# Altium footprint library con-samtec.PCBLIB: 805 footprints (part 48 of 55)
Each footprint in its own frame and in the unit in brackets; x right, y up, seen from the top. Pads: shape width x height; smd on the part's side, far side on the other; paste and mask are expansions set on the pad; w line width, h text height; cw(c..) or ccw(c..) is an arc to the next point about the centre after c.
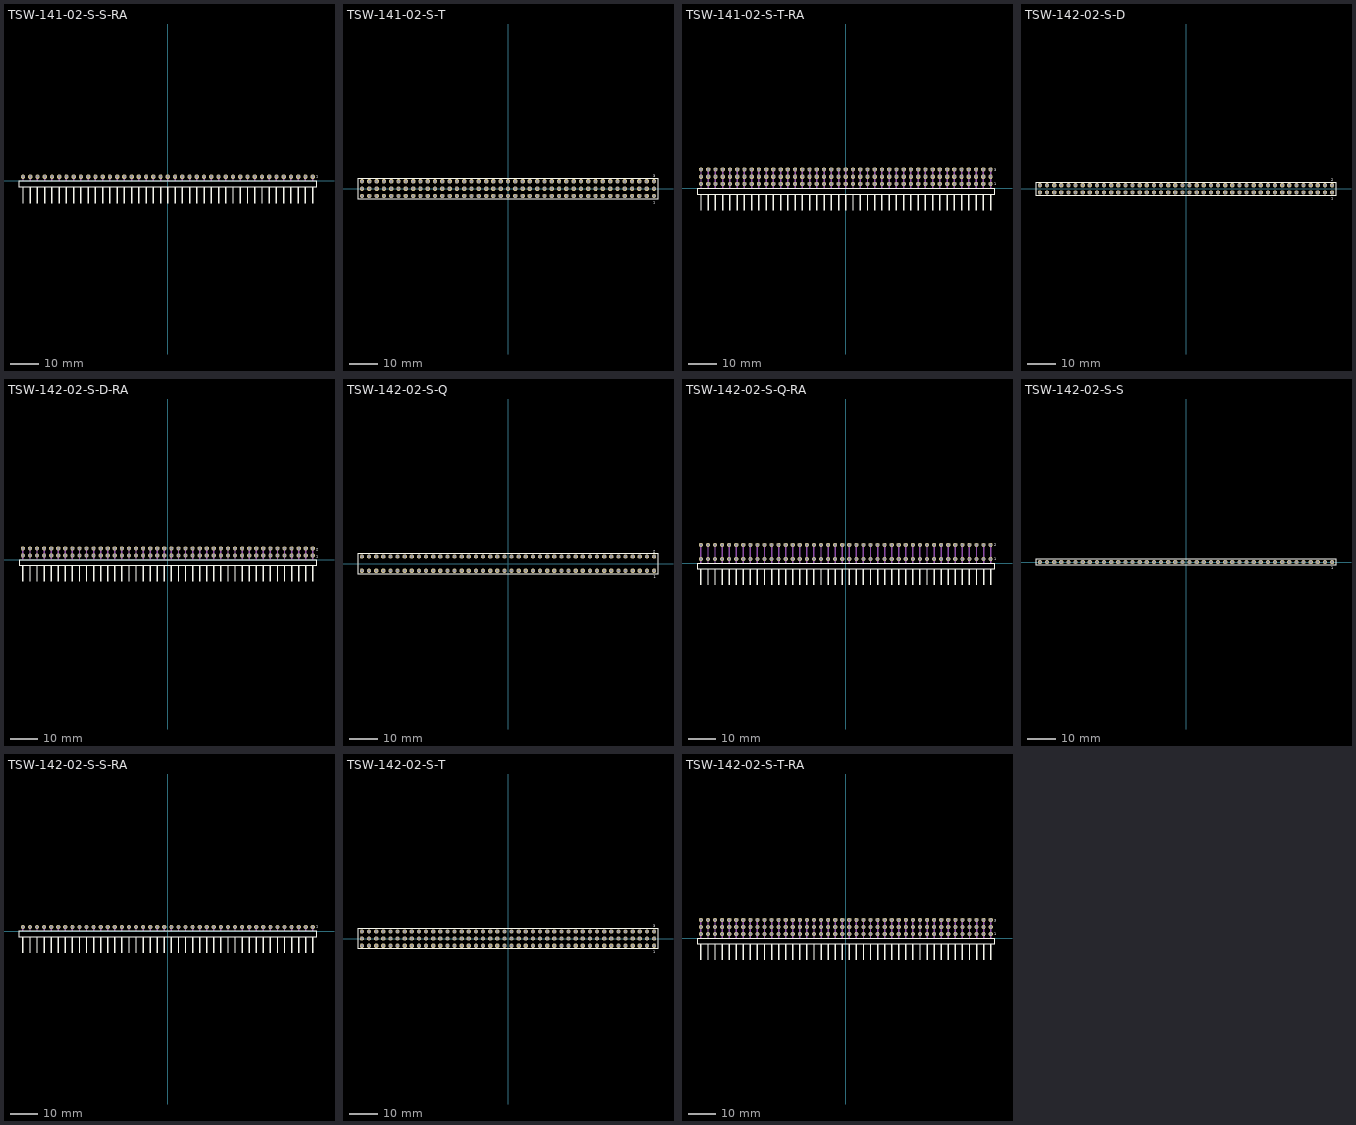
[diagram p47: the footprints below, top view; thin cyan lines are the x and y axes]

## TSW-141-02-S-S-RA [mil]
pads (41):
  oct 59.06x59.06 hole 39.37: 1(2000,60) 2(1900,60) 3(1800,60) 4(1700,60) 5(1600,60) 6(1500,60) 7(1400,60) 8(1300,60) 9(1200,60) 10(1100,60) 11(1000,60) 12(900,60) 13(800,60) 14(700,60) 15(600,60) 16(500,60) 17(400,60) 18(300,60) 19(200,60) 20(100,60) 21(0,60) 22(-100,60) 23(-200,60) 24(-300,60) 25(-400,60) 26(-500,60) 27(-600,60) 28(-700,60) 29(-800,60) 30(-900,60) 31(-1000,60) 32(-1100,60) 33(-1200,60) 34(-1300,60) 35(-1400,60) 36(-1500,60) 37(-1600,60) 38(-1700,60) 39(-1800,60) 40(-1900,60) 41(-2000,60)
Top Overlay:
  rectangle: -2010,-310.63 -1990,-80.32
  rectangle: -1910,-310.63 -1890,-80.32
  rectangle: -1810,-310.63 -1790,-80.32
  rectangle: -1710,-310.63 -1690,-80.32
  rectangle: -1610,-310.63 -1590,-80.32
  rectangle: -1510,-310.63 -1490,-80.32
  rectangle: -1410,-310.63 -1390,-80.32
  rectangle: -1310,-310.63 -1290,-80.32
  rectangle: -1210,-310.63 -1190,-80.32
  rectangle: -1110,-310.63 -1090,-80.32
  rectangle: -1010,-310.63 -990,-80.32
  rectangle: -910,-310.63 -890,-80.32
  rectangle: -810,-310.63 -790,-80.32
  rectangle: -710,-310.63 -690,-80.32
  rectangle: -610,-310.63 -590,-80.32
  rectangle: -510,-310.63 -490,-80.32
  rectangle: -410,-310.63 -390,-80.32
  rectangle: -310,-310.63 -290,-80.32
  rectangle: -210,-310.63 -190,-80.32
  rectangle: -110,-310.63 -90,-80.32
  rectangle: -10,-310.63 10,-80.32
  rectangle: 90,-310.63 110,-80.32
  rectangle: 190,-310.63 210,-80.32
  rectangle: 290,-310.63 310,-80.32
  rectangle: 390,-310.63 410,-80.32
  rectangle: 490,-310.63 510,-80.32
  rectangle: 590,-310.63 610,-80.32
  rectangle: 690,-310.63 710,-80.32
  rectangle: 790,-310.63 810,-80.32
  rectangle: 890,-310.63 910,-80.32
  rectangle: 990,-310.63 1010,-80.32
  rectangle: 1090,-310.63 1110,-80.32
  rectangle: 1190,-310.63 1210,-80.32
  rectangle: 1290,-310.63 1310,-80.32
  rectangle: 1390,-310.63 1410,-80.32
  rectangle: 1490,-310.63 1510,-80.32
  rectangle: 1590,-310.63 1610,-80.32
  rectangle: 1690,-310.63 1710,-80.32
  rectangle: 1790,-310.63 1810,-80.32
  rectangle: 1890,-310.63 1910,-80.32
  rectangle: 1990,-310.63 2010,-80.32
  lines w8: -2055.08,-80.55 2055.08,-80.55 2055.08,-4.17 -2055.08,-4.17 -2055.08,-80.55
  text "1" at 2050.47,45.35 h36.81
Mechanical 16:
  rectangle: -2010,0 -1990,70
  rectangle: -1910,0 -1890,70
  rectangle: -1810,0 -1790,70
  rectangle: -1710,0 -1690,70
  rectangle: -1610,0 -1590,70
  rectangle: -1510,0 -1490,70
  rectangle: -1410,0 -1390,70
  rectangle: -1310,0 -1290,70
  rectangle: -1210,0 -1190,70
  rectangle: -1110,0 -1090,70
  rectangle: -1010,0 -990,70
  rectangle: -910,0 -890,70
  rectangle: -810,0 -790,70
  rectangle: -710,0 -690,70
  rectangle: -610,0 -590,70
  rectangle: -510,0 -490,70
  rectangle: -410,0 -390,70
  rectangle: -310,0 -290,70
  rectangle: -210,0 -190,70
  rectangle: -110,0 -90,70
  rectangle: -10,0 10,70
  rectangle: 90,0 110,70
  rectangle: 190,0 210,70
  rectangle: 290,0 310,70
  rectangle: 390,0 410,70
  rectangle: 490,0 510,70
  rectangle: 590,0 610,70
  rectangle: 690,0 710,70
  rectangle: 790,0 810,70
  rectangle: 890,0 910,70
  rectangle: 990,0 1010,70
  rectangle: 1090,0 1110,70
  rectangle: 1190,0 1210,70
  rectangle: 1290,0 1310,70
  rectangle: 1390,0 1410,70
  rectangle: 1490,0 1510,70
  rectangle: 1590,0 1610,70
  rectangle: 1690,0 1710,70
  rectangle: 1790,0 1810,70
  rectangle: 1890,0 1910,70
  rectangle: 1990,0 2010,70

## TSW-141-02-S-T [mm]
pads (123):
  oct 1.5x1.5 hole 1: 1(50.8,-2.54) 2(50.8,0) 3(50.8,2.54) 4(48.26,-2.54) 5(48.26,0) 6(48.26,2.54) 7(45.72,-2.54) 8(45.72,0) 9(45.72,2.54) 10(43.18,-2.54) 11(43.18,0) 12(43.18,2.54) 13(40.64,-2.54) 14(40.64,0) 15(40.64,2.54) 16(38.1,-2.54) 17(38.1,0) 18(38.1,2.54) 19(35.56,-2.54) 20(35.56,0) 21(35.56,2.54) 22(33.02,-2.54) 23(33.02,0) 24(33.02,2.54) 25(30.48,-2.54) 26(30.48,0) 27(30.48,2.54) 28(27.94,-2.54) 29(27.94,0) 30(27.94,2.54) 31(25.4,-2.54) 32(25.4,0) 33(25.4,2.54) 34(22.86,-2.54) 35(22.86,0) 36(22.86,2.54) 37(20.32,-2.54) 38(20.32,0) 39(20.32,2.54) 40(17.78,-2.54) 41(17.78,0) 42(17.78,2.54) 43(15.24,-2.54) 44(15.24,0) 45(15.24,2.54) 46(12.7,-2.54) 47(12.7,0) 48(12.7,2.54) 49(10.16,-2.54) 50(10.16,0) 51(10.16,2.54) 52(7.62,-2.54) 53(7.62,0) 54(7.62,2.54) 55(5.08,-2.54) 56(5.08,0) 57(5.08,2.54) 58(2.54,-2.54) 59(2.54,0) 60(2.54,2.54) 61(0,-2.54) 62(0,0) 63(0,2.54) 64(-2.54,-2.54) 65(-2.54,0) 66(-2.54,2.54) 67(-5.08,-2.54) 68(-5.08,0) 69(-5.08,2.54) 70(-7.62,-2.54) 71(-7.62,0) 72(-7.62,2.54) 73(-10.16,-2.54) 74(-10.16,0) 75(-10.16,2.54) 76(-12.7,-2.54) 77(-12.7,0) 78(-12.7,2.54) 79(-15.24,-2.54) 80(-15.24,0) 81(-15.24,2.54) 82(-17.78,-2.54) 83(-17.78,0) 84(-17.78,2.54) 85(-20.32,-2.54) 86(-20.32,0) 87(-20.32,2.54) 88(-22.86,-2.54) 89(-22.86,0) 90(-22.86,2.54) 91(-25.4,-2.54) 92(-25.4,0) 93(-25.4,2.54) 94(-27.94,-2.54) 95(-27.94,0) 96(-27.94,2.54) 97(-30.48,-2.54) 98(-30.48,0) 99(-30.48,2.54) 100(-33.02,-2.54) 101(-33.02,0) 102(-33.02,2.54) 103(-35.56,-2.54) 104(-35.56,0) 105(-35.56,2.54) 106(-38.1,-2.54) 107(-38.1,0) 108(-38.1,2.54) 109(-40.64,-2.54) 110(-40.64,0) 111(-40.64,2.54) 112(-43.18,-2.54) 113(-43.18,0) 114(-43.18,2.54) 115(-45.72,-2.54) 116(-45.72,0) 117(-45.72,2.54) 118(-48.26,-2.54) 119(-48.26,0) 120(-48.26,2.54) 121(-50.8,-2.54) 122(-50.8,0) 123(-50.8,2.54)
Top Overlay:
  lines w0.203: -52.199,-3.695 52.199,-3.695 52.199,3.695 -52.199,3.695 -52.199,-3.695
  text "1" at 50.492,-5.188 h0.94
  text "3" at 50.488,3.989 h0.94
Mechanical 16:
  rectangle: -51.15,-2.89 -50.45,-2.19
  rectangle: -51.15,-0.35 -50.45,0.35
  rectangle: -51.15,2.19 -50.45,2.89
  rectangle: -48.61,-2.89 -47.91,-2.19
  rectangle: -48.61,-0.35 -47.91,0.35
  rectangle: -48.61,2.19 -47.91,2.89
  rectangle: -46.07,-2.89 -45.37,-2.19
  rectangle: -46.07,-0.35 -45.37,0.35
  rectangle: -46.07,2.19 -45.37,2.89
  rectangle: -43.53,-2.89 -42.83,-2.19
  rectangle: -43.53,-0.35 -42.83,0.35
  rectangle: -43.53,2.19 -42.83,2.89
  rectangle: -40.99,-2.89 -40.29,-2.19
  rectangle: -40.99,-0.35 -40.29,0.35
  rectangle: -40.99,2.19 -40.29,2.89
  rectangle: -38.45,-2.89 -37.75,-2.19
  rectangle: -38.45,-0.35 -37.75,0.35
  rectangle: -38.45,2.19 -37.75,2.89
  rectangle: -35.91,-2.89 -35.21,-2.19
  rectangle: -35.91,-0.35 -35.21,0.35
  rectangle: -35.91,2.19 -35.21,2.89
  rectangle: -33.37,-2.89 -32.67,-2.19
  rectangle: -33.37,-0.35 -32.67,0.35
  rectangle: -33.37,2.19 -32.67,2.89
  rectangle: -30.83,-2.89 -30.13,-2.19
  rectangle: -30.83,-0.35 -30.13,0.35
  rectangle: -30.83,2.19 -30.13,2.89
  rectangle: -28.29,-2.89 -27.59,-2.19
  rectangle: -28.29,-0.35 -27.59,0.35
  rectangle: -28.29,2.19 -27.59,2.89
  rectangle: -25.75,-2.89 -25.05,-2.19
  rectangle: -25.75,-0.35 -25.05,0.35
  rectangle: -25.75,2.19 -25.05,2.89
  rectangle: -23.21,-2.89 -22.51,-2.19
  rectangle: -23.21,-0.35 -22.51,0.35
  rectangle: -23.21,2.19 -22.51,2.89
  rectangle: -20.67,-2.89 -19.97,-2.19
  rectangle: -20.67,-0.35 -19.97,0.35
  rectangle: -20.67,2.19 -19.97,2.89
  rectangle: -18.13,-2.89 -17.43,-2.19
  rectangle: -18.13,-0.35 -17.43,0.35
  rectangle: -18.13,2.19 -17.43,2.89
  rectangle: -15.59,-2.89 -14.89,-2.19
  rectangle: -15.59,-0.35 -14.89,0.35
  rectangle: -15.59,2.19 -14.89,2.89
  rectangle: -13.05,-2.89 -12.35,-2.19
  rectangle: -13.05,-0.35 -12.35,0.35
  rectangle: -13.05,2.19 -12.35,2.89
  rectangle: -10.51,-2.89 -9.81,-2.19
  rectangle: -10.51,-0.35 -9.81,0.35
  rectangle: -10.51,2.19 -9.81,2.89
  rectangle: -7.97,-2.89 -7.27,-2.19
  rectangle: -7.97,-0.35 -7.27,0.35
  rectangle: -7.97,2.19 -7.27,2.89
  rectangle: -5.43,-2.89 -4.73,-2.19
  rectangle: -5.43,-0.35 -4.73,0.35
  rectangle: -5.43,2.19 -4.73,2.89
  rectangle: -2.89,-2.89 -2.19,-2.19
  rectangle: -2.89,-0.35 -2.19,0.35
  rectangle: -2.89,2.19 -2.19,2.89
  rectangle: -0.35,-2.89 0.35,-2.19
  rectangle: -0.35,-0.35 0.35,0.35
  rectangle: -0.35,2.19 0.35,2.89
  rectangle: 2.19,-2.89 2.89,-2.19
  rectangle: 2.19,-0.35 2.89,0.35
  rectangle: 2.19,2.19 2.89,2.89
  rectangle: 4.73,-2.89 5.43,-2.19
  rectangle: 4.73,-0.35 5.43,0.35
  rectangle: 4.73,2.19 5.43,2.89
  rectangle: 7.27,-2.89 7.97,-2.19
  rectangle: 7.27,-0.35 7.97,0.35
  rectangle: 7.27,2.19 7.97,2.89
  rectangle: 9.81,-2.89 10.51,-2.19
  rectangle: 9.81,-0.35 10.51,0.35
  rectangle: 9.81,2.19 10.51,2.89
  rectangle: 12.35,-2.89 13.05,-2.19
  rectangle: 12.35,-0.35 13.05,0.35
  rectangle: 12.35,2.19 13.05,2.89
  rectangle: 14.89,-2.89 15.59,-2.19
  rectangle: 14.89,-0.35 15.59,0.35
  rectangle: 14.89,2.19 15.59,2.89
  rectangle: 17.43,-2.89 18.13,-2.19
  rectangle: 17.43,-0.35 18.13,0.35
  rectangle: 17.43,2.19 18.13,2.89
  rectangle: 19.97,-2.89 20.67,-2.19
  rectangle: 19.97,-0.35 20.67,0.35
  rectangle: 19.97,2.19 20.67,2.89
  rectangle: 22.51,-2.89 23.21,-2.19
  rectangle: 22.51,-0.35 23.21,0.35
  rectangle: 22.51,2.19 23.21,2.89
  rectangle: 25.05,-2.89 25.75,-2.19
  rectangle: 25.05,-0.35 25.75,0.35
  rectangle: 25.05,2.19 25.75,2.89
  rectangle: 27.59,-2.89 28.29,-2.19
  rectangle: 27.59,-0.35 28.29,0.35
  rectangle: 27.59,2.19 28.29,2.89
  rectangle: 30.13,-2.89 30.83,-2.19
  rectangle: 30.13,-0.35 30.83,0.35
  rectangle: 30.13,2.19 30.83,2.89
  rectangle: 32.67,-2.89 33.37,-2.19
  rectangle: 32.67,-0.35 33.37,0.35
  rectangle: 32.67,2.19 33.37,2.89
  rectangle: 35.21,-2.89 35.91,-2.19
  rectangle: 35.21,-0.35 35.91,0.35
  rectangle: 35.21,2.19 35.91,2.89
  rectangle: 37.75,-2.89 38.45,-2.19
  rectangle: 37.75,-0.35 38.45,0.35
  rectangle: 37.75,2.19 38.45,2.89
  rectangle: 40.29,-2.89 40.99,-2.19
  rectangle: 40.29,-0.35 40.99,0.35
  rectangle: 40.29,2.19 40.99,2.89
  rectangle: 42.83,-2.89 43.53,-2.19
  rectangle: 42.83,-0.35 43.53,0.35
  rectangle: 42.83,2.19 43.53,2.89
  rectangle: 45.37,-2.89 46.07,-2.19
  rectangle: 45.37,-0.35 46.07,0.35
  rectangle: 45.37,2.19 46.07,2.89
  rectangle: 47.91,-2.89 48.61,-2.19
  rectangle: 47.91,-0.35 48.61,0.35
  rectangle: 47.91,2.19 48.61,2.89
  rectangle: 50.45,-2.89 51.15,-2.19
  rectangle: 50.45,-0.35 51.15,0.35
  rectangle: 50.45,2.19 51.15,2.89

## TSW-141-02-S-T-RA [mil]
pads (123):
  oct 59.06x59.06 hole 39.37: 1(2000,60) 2(2000,160) 3(2000,260) 4(1900,60) 5(1900,160) 6(1900,260) 7(1800,60) 8(1800,160) 9(1800,260) 10(1700,60) 11(1700,160) 12(1700,260) 13(1600,60) 14(1600,160) 15(1600,260) 16(1500,60) 17(1500,160) 18(1500,260) 19(1400,60) 20(1400,160) 21(1400,260) 22(1300,60) 23(1300,160) 24(1300,260) 25(1200,60) 26(1200,160) 27(1200,260) 28(1100,60) 29(1100,160) 30(1100,260) 31(1000,60) 32(1000,160) 33(1000,260) 34(900,60) 35(900,160) 36(900,260) 37(800,60) 38(800,160) 39(800,260) 40(700,60) 41(700,160) 42(700,260) 43(600,60) 44(600,160) 45(600,260) 46(500,60) 47(500,160) 48(500,260) 49(400,60) 50(400,160) 51(400,260) 52(300,60) 53(300,160) 54(300,260) 55(200,60) 56(200,160) 57(200,260) 58(100,60) 59(100,160) 60(100,260) 61(0,60) 62(0,160) 63(0,260) 64(-100,60) 65(-100,160) 66(-100,260) 67(-200,60) 68(-200,160) 69(-200,260) 70(-300,60) 71(-300,160) 72(-300,260) 73(-400,60) 74(-400,160) 75(-400,260) 76(-500,60) 77(-500,160) 78(-500,260) 79(-600,60) 80(-600,160) 81(-600,260) 82(-700,60) 83(-700,160) 84(-700,260) 85(-800,60) 86(-800,160) 87(-800,260) 88(-900,60) 89(-900,160) 90(-900,260) 91(-1000,60) 92(-1000,160) 93(-1000,260) 94(-1100,60) 95(-1100,160) 96(-1100,260) 97(-1200,60) 98(-1200,160) 99(-1200,260) 100(-1300,60) 101(-1300,160) 102(-1300,260) 103(-1400,60) 104(-1400,160) 105(-1400,260) 106(-1500,60) 107(-1500,160) 108(-1500,260) 109(-1600,60) 110(-1600,160) 111(-1600,260) 112(-1700,60) 113(-1700,160) 114(-1700,260) 115(-1800,60) 116(-1800,160) 117(-1800,260) 118(-1900,60) 119(-1900,160) 120(-1900,260) 121(-2000,60) 122(-2000,160) 123(-2000,260)
Top Overlay:
  rectangle: -2010,-310.63 -1990,-80.32
  rectangle: -1910,-310.63 -1890,-80.32
  rectangle: -1810,-310.63 -1790,-80.32
  rectangle: -1710,-310.63 -1690,-80.32
  rectangle: -1610,-310.63 -1590,-80.32
  rectangle: -1510,-310.63 -1490,-80.32
  rectangle: -1410,-310.63 -1390,-80.32
  rectangle: -1310,-310.63 -1290,-80.32
  rectangle: -1210,-310.63 -1190,-80.32
  rectangle: -1110,-310.63 -1090,-80.32
  rectangle: -1010,-310.63 -990,-80.32
  rectangle: -910,-310.63 -890,-80.32
  rectangle: -810,-310.63 -790,-80.32
  rectangle: -710,-310.63 -690,-80.32
  rectangle: -610,-310.63 -590,-80.32
  rectangle: -510,-310.63 -490,-80.32
  rectangle: -410,-310.63 -390,-80.32
  rectangle: -310,-310.63 -290,-80.32
  rectangle: -210,-310.63 -190,-80.32
  rectangle: -110,-310.63 -90,-80.32
  rectangle: -10,-310.63 10,-80.32
  rectangle: 90,-310.63 110,-80.32
  rectangle: 190,-310.63 210,-80.32
  rectangle: 290,-310.63 310,-80.32
  rectangle: 390,-310.63 410,-80.32
  rectangle: 490,-310.63 510,-80.32
  rectangle: 590,-310.63 610,-80.32
  rectangle: 690,-310.63 710,-80.32
  rectangle: 790,-310.63 810,-80.32
  rectangle: 890,-310.63 910,-80.32
  rectangle: 990,-310.63 1010,-80.32
  rectangle: 1090,-310.63 1110,-80.32
  rectangle: 1190,-310.63 1210,-80.32
  rectangle: 1290,-310.63 1310,-80.32
  rectangle: 1390,-310.63 1410,-80.32
  rectangle: 1490,-310.63 1510,-80.32
  rectangle: 1590,-310.63 1610,-80.32
  rectangle: 1690,-310.63 1710,-80.32
  rectangle: 1790,-310.63 1810,-80.32
  rectangle: 1890,-310.63 1910,-80.32
  rectangle: 1990,-310.63 2010,-80.32
  lines w8: -2055.08,-80.55 2055.08,-80.55 2055.08,-4.17 -2055.08,-4.17 -2055.08,-80.55
  text "1" at 2051.57,41.34 h36.81
  text "3" at 2052.17,236.81 h36.81
Mechanical 16:
  rectangle: -2010,0 -1990,270
  rectangle: -1910,0 -1890,270
  rectangle: -1810,0 -1790,270
  rectangle: -1710,0 -1690,270
  rectangle: -1610,0 -1590,270
  rectangle: -1510,0 -1490,270
  rectangle: -1410,0 -1390,270
  rectangle: -1310,0 -1290,270
  rectangle: -1210,0 -1190,270
  rectangle: -1110,0 -1090,270
  rectangle: -1010,0 -990,270
  rectangle: -910,0 -890,270
  rectangle: -810,0 -790,270
  rectangle: -710,0 -690,270
  rectangle: -610,0 -590,270
  rectangle: -510,0 -490,270
  rectangle: -410,0 -390,270
  rectangle: -310,0 -290,270
  rectangle: -210,0 -190,270
  rectangle: -110,0 -90,270
  rectangle: -10,0 10,270
  rectangle: 90,0 110,270
  rectangle: 190,0 210,270
  rectangle: 290,0 310,270
  rectangle: 390,0 410,270
  rectangle: 490,0 510,270
  rectangle: 590,0 610,270
  rectangle: 690,0 710,270
  rectangle: 790,0 810,270
  rectangle: 890,0 910,270
  rectangle: 990,0 1010,270
  rectangle: 1090,0 1110,270
  rectangle: 1190,0 1210,270
  rectangle: 1290,0 1310,270
  rectangle: 1390,0 1410,270
  rectangle: 1490,0 1510,270
  rectangle: 1590,0 1610,270
  rectangle: 1690,0 1710,270
  rectangle: 1790,0 1810,270
  rectangle: 1890,0 1910,270
  rectangle: 1990,0 2010,270

## TSW-142-02-S-D [mm]
pads (84):
  oct 1.5x1.5 hole 1: 1(52.07,-1.27) 2(52.07,1.27) 3(49.53,-1.27) 4(49.53,1.27) 5(46.99,-1.27) 6(46.99,1.27) 7(44.45,-1.27) 8(44.45,1.27) 9(41.91,-1.27) 10(41.91,1.27) 11(39.37,-1.27) 12(39.37,1.27) 13(36.83,-1.27) 14(36.83,1.27) 15(34.29,-1.27) 16(34.29,1.27) 17(31.75,-1.27) 18(31.75,1.27) 19(29.21,-1.27) 20(29.21,1.27) 21(26.67,-1.27) 22(26.67,1.27) 23(24.13,-1.27) 24(24.13,1.27) 25(21.59,-1.27) 26(21.59,1.27) 27(19.05,-1.27) 28(19.05,1.27) 29(16.51,-1.27) 30(16.51,1.27) 31(13.97,-1.27) 32(13.97,1.27) 33(11.43,-1.27) 34(11.43,1.27) 35(8.89,-1.27) 36(8.89,1.27) 37(6.35,-1.27) 38(6.35,1.27) 39(3.81,-1.27) 40(3.81,1.27) 41(1.27,-1.27) 42(1.27,1.27) 43(-1.27,-1.27) 44(-1.27,1.27) 45(-3.81,-1.27) 46(-3.81,1.27) 47(-6.35,-1.27) 48(-6.35,1.27) 49(-8.89,-1.27) 50(-8.89,1.27) 51(-11.43,-1.27) 52(-11.43,1.27) 53(-13.97,-1.27) 54(-13.97,1.27) 55(-16.51,-1.27) 56(-16.51,1.27) 57(-19.05,-1.27) 58(-19.05,1.27) 59(-21.59,-1.27) 60(-21.59,1.27) 61(-24.13,-1.27) 62(-24.13,1.27) 63(-26.67,-1.27) 64(-26.67,1.27) 65(-29.21,-1.27) 66(-29.21,1.27) 67(-31.75,-1.27) 68(-31.75,1.27) 69(-34.29,-1.27) 70(-34.29,1.27) 71(-36.83,-1.27) 72(-36.83,1.27) 73(-39.37,-1.27) 74(-39.37,1.27) 75(-41.91,-1.27) 76(-41.91,1.27) 77(-44.45,-1.27) 78(-44.45,1.27) 79(-46.99,-1.27) 80(-46.99,1.27) 81(-49.53,-1.27) 82(-49.53,1.27) 83(-52.07,-1.27) 84(-52.07,1.27)
Top Overlay:
  lines w0.203: -53.469,-2.425 53.469,-2.425 53.469,2.425 -53.469,2.425 -53.469,-2.425
  text "1" at 51.862,-3.818 h0.94
  text "2" at 51.687,2.744 h0.94
Mechanical 16:
  rectangle: -52.42,-1.62 -51.72,-0.92
  rectangle: -52.42,0.92 -51.72,1.62
  rectangle: -49.88,-1.62 -49.18,-0.92
  rectangle: -49.88,0.92 -49.18,1.62
  rectangle: -47.34,-1.62 -46.64,-0.92
  rectangle: -47.34,0.92 -46.64,1.62
  rectangle: -44.8,-1.62 -44.1,-0.92
  rectangle: -44.8,0.92 -44.1,1.62
  rectangle: -42.26,-1.62 -41.56,-0.92
  rectangle: -42.26,0.92 -41.56,1.62
  rectangle: -39.72,-1.62 -39.02,-0.92
  rectangle: -39.72,0.92 -39.02,1.62
  rectangle: -37.18,-1.62 -36.48,-0.92
  rectangle: -37.18,0.92 -36.48,1.62
  rectangle: -34.64,-1.62 -33.94,-0.92
  rectangle: -34.64,0.92 -33.94,1.62
  rectangle: -32.1,-1.62 -31.4,-0.92
  rectangle: -32.1,0.92 -31.4,1.62
  rectangle: -29.56,-1.62 -28.86,-0.92
  rectangle: -29.56,0.92 -28.86,1.62
  rectangle: -27.02,-1.62 -26.32,-0.92
  rectangle: -27.02,0.92 -26.32,1.62
  rectangle: -24.48,-1.62 -23.78,-0.92
  rectangle: -24.48,0.92 -23.78,1.62
  rectangle: -21.94,-1.62 -21.24,-0.92
  rectangle: -21.94,0.92 -21.24,1.62
  rectangle: -19.4,-1.62 -18.7,-0.92
  rectangle: -19.4,0.92 -18.7,1.62
  rectangle: -16.86,-1.62 -16.16,-0.92
  rectangle: -16.86,0.92 -16.16,1.62
  rectangle: -14.32,-1.62 -13.62,-0.92
  rectangle: -14.32,0.92 -13.62,1.62
  rectangle: -11.78,-1.62 -11.08,-0.92
  rectangle: -11.78,0.92 -11.08,1.62
  rectangle: -9.24,-1.62 -8.54,-0.92
  rectangle: -9.24,0.92 -8.54,1.62
  rectangle: -6.7,-1.62 -6,-0.92
  rectangle: -6.7,0.92 -6,1.62
  rectangle: -4.16,-1.62 -3.46,-0.92
  rectangle: -4.16,0.92 -3.46,1.62
  rectangle: -1.62,-1.62 -0.92,-0.92
  rectangle: -1.62,0.92 -0.92,1.62
  rectangle: 0.92,-1.62 1.62,-0.92
  rectangle: 0.92,0.92 1.62,1.62
  rectangle: 3.46,-1.62 4.16,-0.92
  rectangle: 3.46,0.92 4.16,1.62
  rectangle: 6,-1.62 6.7,-0.92
  rectangle: 6,0.92 6.7,1.62
  rectangle: 8.54,-1.62 9.24,-0.92
  rectangle: 8.54,0.92 9.24,1.62
  rectangle: 11.08,-1.62 11.78,-0.92
  rectangle: 11.08,0.92 11.78,1.62
  rectangle: 13.62,-1.62 14.32,-0.92
  rectangle: 13.62,0.92 14.32,1.62
  rectangle: 16.16,-1.62 16.86,-0.92
  rectangle: 16.16,0.92 16.86,1.62
  rectangle: 18.7,-1.62 19.4,-0.92
  rectangle: 18.7,0.92 19.4,1.62
  rectangle: 21.24,-1.62 21.94,-0.92
  rectangle: 21.24,0.92 21.94,1.62
  rectangle: 23.78,-1.62 24.48,-0.92
  rectangle: 23.78,0.92 24.48,1.62
  rectangle: 26.32,-1.62 27.02,-0.92
  rectangle: 26.32,0.92 27.02,1.62
  rectangle: 28.86,-1.62 29.56,-0.92
  rectangle: 28.86,0.92 29.56,1.62
  rectangle: 31.4,-1.62 32.1,-0.92
  rectangle: 31.4,0.92 32.1,1.62
  rectangle: 33.94,-1.62 34.64,-0.92
  rectangle: 33.94,0.92 34.64,1.62
  rectangle: 36.48,-1.62 37.18,-0.92
  rectangle: 36.48,0.92 37.18,1.62
  rectangle: 39.02,-1.62 39.72,-0.92
  rectangle: 39.02,0.92 39.72,1.62
  rectangle: 41.56,-1.62 42.26,-0.92
  rectangle: 41.56,0.92 42.26,1.62
  rectangle: 44.1,-1.62 44.8,-0.92
  rectangle: 44.1,0.92 44.8,1.62
  rectangle: 46.64,-1.62 47.34,-0.92
  rectangle: 46.64,0.92 47.34,1.62
  rectangle: 49.18,-1.62 49.88,-0.92
  rectangle: 49.18,0.92 49.88,1.62
  rectangle: 51.72,-1.62 52.42,-0.92
  rectangle: 51.72,0.92 52.42,1.62

## TSW-142-02-S-D-RA [mil]
pads (84):
  oct 59.06x59.06 hole 39.37: 1(2050,60) 2(2050,160) 3(1950,60) 4(1950,160) 5(1850,60) 6(1850,160) 7(1750,60) 8(1750,160) 9(1650,60) 10(1650,160) 11(1550,60) 12(1550,160) 13(1450,60) 14(1450,160) 15(1350,60) 16(1350,160) 17(1250,60) 18(1250,160) 19(1150,60) 20(1150,160) 21(1050,60) 22(1050,160) 23(950,60) 24(950,160) 25(850,60) 26(850,160) 27(750,60) 28(750,160) 29(650,60) 30(650,160) 31(550,60) 32(550,160) 33(450,60) 34(450,160) 35(350,60) 36(350,160) 37(250,60) 38(250,160) 39(150,60) 40(150,160) 41(50,60) 42(50,160) 43(-50,60) 44(-50,160) 45(-150,60) 46(-150,160) 47(-250,60) 48(-250,160) 49(-350,60) 50(-350,160) 51(-450,60) 52(-450,160) 53(-550,60) 54(-550,160) 55(-650,60) 56(-650,160) 57(-750,60) 58(-750,160) 59(-850,60) 60(-850,160) 61(-950,60) 62(-950,160) 63(-1050,60) 64(-1050,160) 65(-1150,60) 66(-1150,160) 67(-1250,60) 68(-1250,160) 69(-1350,60) 70(-1350,160) 71(-1450,60) 72(-1450,160) 73(-1550,60) 74(-1550,160) 75(-1650,60) 76(-1650,160) 77(-1750,60) 78(-1750,160) 79(-1850,60) 80(-1850,160) 81(-1950,60) 82(-1950,160) 83(-2050,60) 84(-2050,160)
Top Overlay:
  rectangle: -2060,-310.63 -2040,-80.32
  rectangle: -1960,-310.63 -1940,-80.32
  rectangle: -1860,-310.63 -1840,-80.32
  rectangle: -1760,-310.63 -1740,-80.32
  rectangle: -1660,-310.63 -1640,-80.32
  rectangle: -1560,-310.63 -1540,-80.32
  rectangle: -1460,-310.63 -1440,-80.32
  rectangle: -1360,-310.63 -1340,-80.32
  rectangle: -1260,-310.63 -1240,-80.32
  rectangle: -1160,-310.63 -1140,-80.32
  rectangle: -1060,-310.63 -1040,-80.32
  rectangle: -960,-310.63 -940,-80.32
  rectangle: -860,-310.63 -840,-80.32
  rectangle: -760,-310.63 -740,-80.32
  rectangle: -660,-310.63 -640,-80.32
  rectangle: -560,-310.63 -540,-80.32
  rectangle: -460,-310.63 -440,-80.32
  rectangle: -360,-310.63 -340,-80.32
  rectangle: -260,-310.63 -240,-80.32
  rectangle: -160,-310.63 -140,-80.32
  rectangle: -60,-310.63 -40,-80.32
  rectangle: 40,-310.63 60,-80.32
  rectangle: 140,-310.63 160,-80.32
  rectangle: 240,-310.63 260,-80.32
  rectangle: 340,-310.63 360,-80.32
  rectangle: 440,-310.63 460,-80.32
  rectangle: 540,-310.63 560,-80.32
  rectangle: 640,-310.63 660,-80.32
  rectangle: 740,-310.63 760,-80.32
  rectangle: 840,-310.63 860,-80.32
  rectangle: 940,-310.63 960,-80.32
  rectangle: 1040,-310.63 1060,-80.32
  rectangle: 1140,-310.63 1160,-80.32
  rectangle: 1240,-310.63 1260,-80.32
  rectangle: 1340,-310.63 1360,-80.32
  rectangle: 1440,-310.63 1460,-80.32
  rectangle: 1540,-310.63 1560,-80.32
  rectangle: 1640,-310.63 1660,-80.32
  rectangle: 1740,-310.63 1760,-80.32
  rectangle: 1840,-310.63 1860,-80.32
  rectangle: 1940,-310.63 1960,-80.32
  rectangle: 2040,-310.63 2060,-80.32
  lines w8: -2105.08,-80.55 2105.08,-80.55 2105.08,-4.17 -2105.08,-4.17 -2105.08,-80.55
  text "1" at 2100.59,30.51 h36.81
  text "2" at 2099.21,129.53 h36.81
Mechanical 16:
  rectangle: -2060,0 -2040,170
  rectangle: -1960,0 -1940,170
  rectangle: -1860,0 -1840,170
  rectangle: -1760,0 -1740,170
  rectangle: -1660,0 -1640,170
  rectangle: -1560,0 -1540,170
  rectangle: -1460,0 -1440,170
  rectangle: -1360,0 -1340,170
  rectangle: -1260,0 -1240,170
  rectangle: -1160,0 -1140,170
  rectangle: -1060,0 -1040,170
  rectangle: -960,0 -940,170
  rectangle: -860,0 -840,170
  rectangle: -760,0 -740,170
  rectangle: -660,0 -640,170
  rectangle: -560,0 -540,170
  rectangle: -460,0 -440,170
  rectangle: -360,0 -340,170
  rectangle: -260,0 -240,170
  rectangle: -160,0 -140,170
  rectangle: -60,0 -40,170
  rectangle: 40,0 60,170
  rectangle: 140,0 160,170
  rectangle: 240,0 260,170